# Altium footprint library goldpin_female_pcb.PcbLib: 81 footprints (part 3 of 6)
Each footprint in its own frame and in the unit in brackets; x right, y up, seen from the top. Pads: shape width x height; smd on the part's side, far side on the other; paste and mask are expansions set on the pad; w line width, h text height; cw(c..) or ccw(c..) is an arc to the next point about the centre after c.
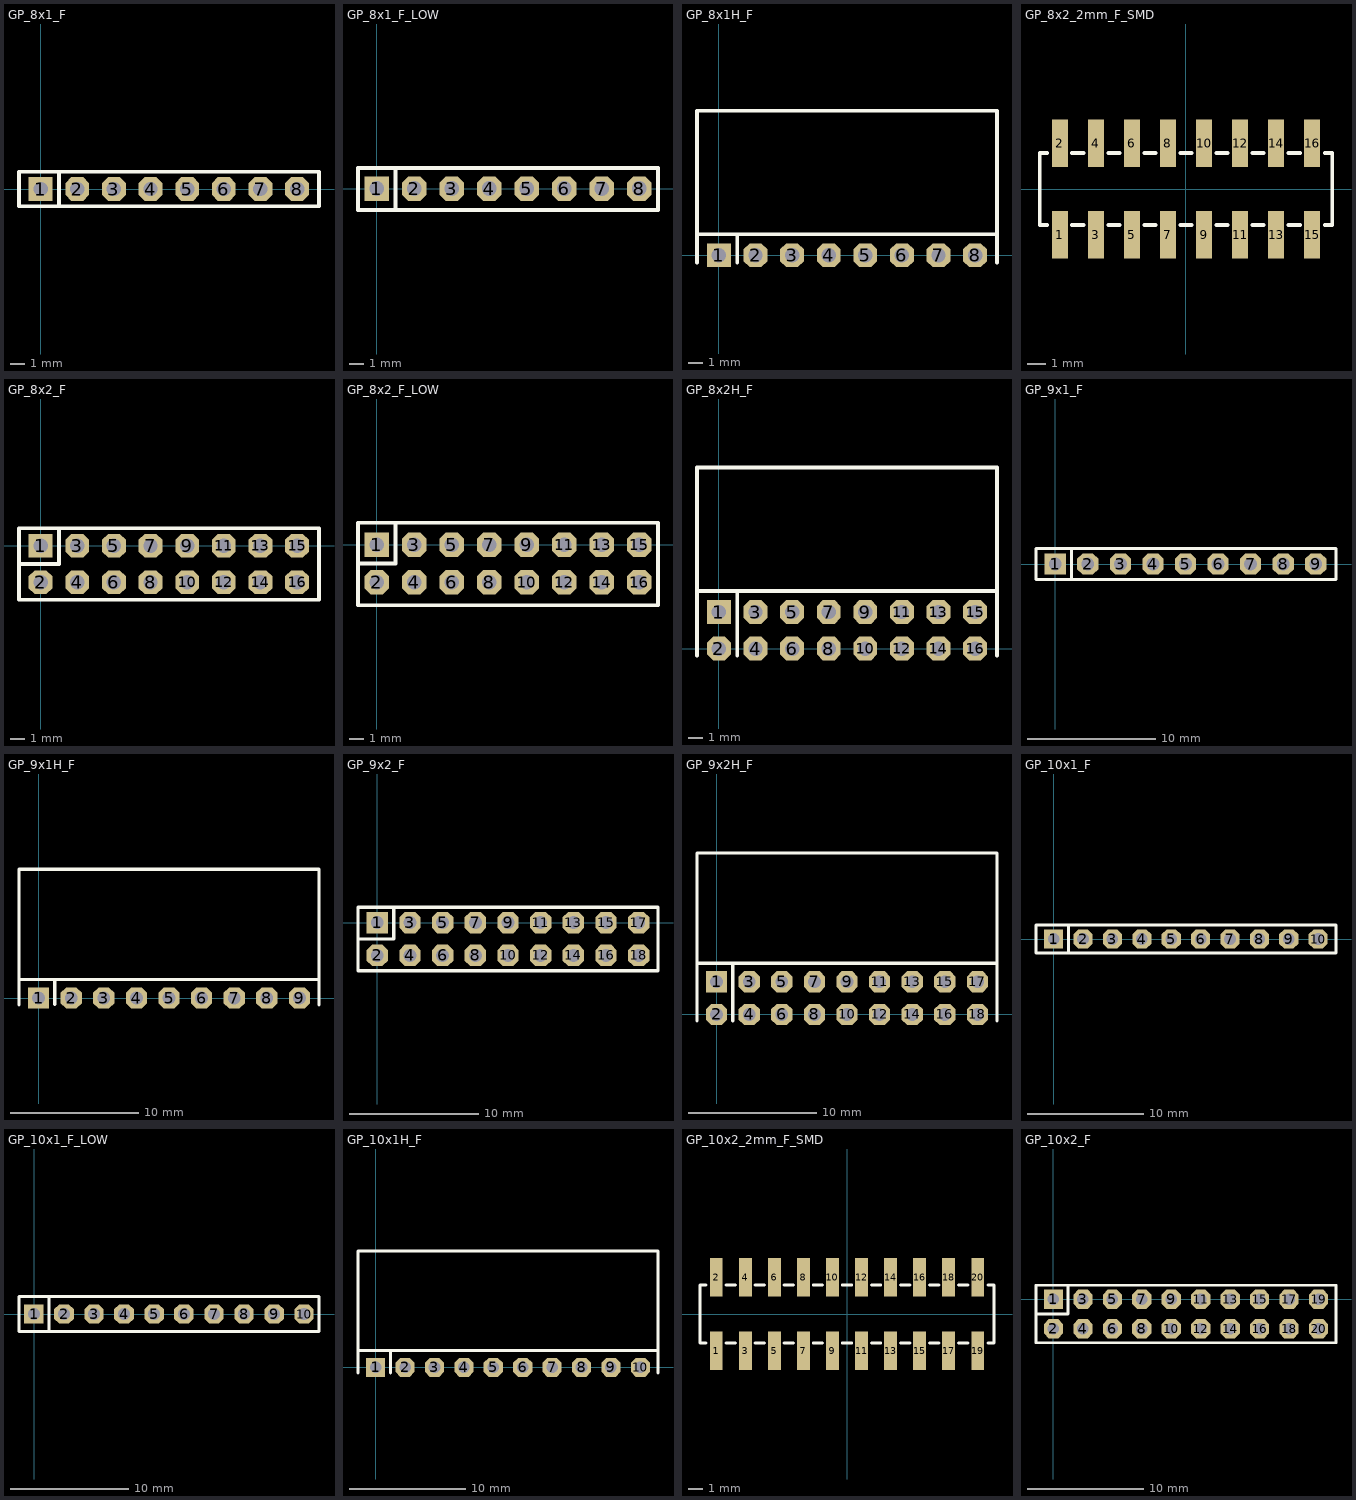
[diagram p2: the footprints below, top view; thin cyan lines are the x and y axes]

## GP_8x1_F [mil]
pads (8):
  rect 65x65 hole 39.37: 1(0,0)
  oct 65x65 hole 39.37: 2(100,0) 3(200,0) 4(300,0) 5(400,0) 6(500,0) 7(600,0) 8(700,0)
Top Overlay:
  lines w10: 50,-47.24 50,47.24 ; -59.06,-47.24 -59.06,47.24 759.84,47.24 759.84,-47.24 -59.06,-47.24
3D body "Samtec-SSW-108-01-G-S.step": height 335, standoff -104, extent -60,-47.49 760,47.51

## GP_8x1_F_LOW [mil]
pads (8):
  rect 65x65 hole 39.37: 1(0,0)
  oct 65x65 hole 39.37: 2(100,0) 3(200,0) 4(300,0) 5(400,0) 6(500,0) 7(600,0) 8(700,0)
Top Overlay:
  lines w10: 50,-57.09 50,55.12 ; -50,-57.09 750,-57.09 750,55.12 -50,55.12 -50,-57.09
3D body "Samtec-CES-108-01-G-S.step": height 200.79, standoff -127.21, extent -51.18,-61.97 748.82,58.03

## GP_8x1H_F [mil]
pads (8):
  rect 65x65 hole 39.37: 1(0,0)
  oct 65x65 hole 39.37: 2(100,0) 3(200,0) 4(300,0) 5(400,0) 6(500,0) 7(600,0) 8(700,0)
Top Overlay:
  lines w10: -60,-20 -60,395 760,395 760,-20 ; -60,57.24 759.84,57.24 ; 50,-19.68 50,57.24
3D body "Samtec-SSW-108-22-G-S-RA.step": height 96.71, standoff -98.29, extent -60,-10 760,393

## GP_8x2_2mm_F_SMD [mm]
pads (16):
  rect 0.89x2.65 smd: 1(-7,-2.54) 2(-7,2.54) 3(-5,-2.54) 4(-5,2.54) 5(-3,-2.54) 6(-3,2.54) 7(-1,-2.54) 8(-1,2.54) 9(1,-2.54) 10(1,2.54) 11(3,-2.54) 12(3,2.54) 13(5,-2.54) 14(5,2.54) 15(7,-2.54) 16(7,2.54)
Top Overlay:
  lines w0.2: -7.7,-2 -8.125,-2 -8.125,2 -7.7,2 ; -6.325,-2 -5.675,-2 ; -6.325,2 -5.675,2 ; -4.325,-2 -3.675,-2 ; -4.325,2 -3.675,2 ; -2.325,-2 -1.675,-2 ; -2.325,2 -1.675,2 ; -0.325,-2 0.325,-2 ; -0.325,2 0.325,2 ; 1.675,-2 2.325,-2 ; 1.675,2 2.325,2 ; 3.675,-2 4.325,-2 ; 3.675,2 4.325,2 ; 5.675,-2 6.325,-2 ; 5.675,2 6.325,2 ; 7.7,-2 8.125,-2 8.125,2 7.7,2
3D body "Samtec-MMS-108-2-L-DV.STEP": height 4.44, standoff -0.05, extent -8.125,-3.218 8.113,3.218

## GP_8x2_F [mil]
pads (16):
  rect 65x65 hole 39.37: 1(0,0)
  oct 65x65 hole 39.37: 2(0,-100) 3(100,0) 4(100,-100) 5(200,0) 6(200,-100) 7(300,0) 8(300,-100) 9(400,0) 10(400,-100) 11(500,0) 12(500,-100) 13(600,0) 14(600,-100) 15(700,0) 16(700,-100)
Top Overlay:
  lines w10: -59.06,-50 50,-50 50,47.51 ; -59.06,-147.49 759.84,-147.49 759.84,47.51 -59.06,47.51 -59.06,-147.49
3D body "Samtec-SSW-108-01-G-D.step": height 335, standoff -104, extent -60,-147.49 760,47.51

## GP_8x2_F_LOW [mil]
pads (16):
  rect 65x65 hole 39.37: 1(0,0)
  oct 65x65 hole 39.37: 2(0,-100) 3(100,0) 4(100,-100) 5(200,0) 6(200,-100) 7(300,0) 8(300,-100) 9(400,0) 10(400,-100) 11(500,0) 12(500,-100) 13(600,0) 14(600,-100) 15(700,0) 16(700,-100)
Top Overlay:
  lines w10: -50,-50 50,-50 50,59.06 ; 750,-161.42 -50,-161.42 -50,59.06 750,59.06 750,-159.06
3D body "Samtec-CES-108-01-G-D.step": height 200.79, standoff -127.21, extent -49.6,-160.79 750.39,59.21

## GP_8x2H_F [mil]
pads (16):
  rect 65x65 hole 39.37: 1(0,100)
  oct 65x65 hole 39.37: 2(0,0) 3(100,100) 4(100,0) 5(200,100) 6(200,0) 7(300,100) 8(300,0) 9(400,100) 10(400,0) 11(500,100) 12(500,0) 13(600,100) 14(600,0) 15(700,100) 16(700,0)
Top Overlay:
  lines w10: -60,-20 -60,495 760,495 760,-20 ; -60,157.24 760,157.24 ; 50,-20 50,157.24
3D body "Samtec-SSW-108-22-G-D-RA.step": height 197.89, standoff -97.11, extent -59.06,-10.87 760.94,492.13

## GP_9x1_F [mil]
pads (9):
  rect 65x65 hole 39.37: 1(0,0)
  oct 65x65 hole 39.37: 2(100,0) 3(200,0) 4(300,0) 5(400,0) 6(500,0) 7(600,0) 8(700,0) 9(800,0)
Top Overlay:
  lines w10: 50,-47.24 50,45 ; -59.06,-47.24 -59.06,47.24 862.2,47.24 862.2,-47.24 -59.06,-47.24
3D body "Samtec-SSW-109-01-G-S.step": height 335, standoff -104, extent -60,-47.5 860,47.5

## GP_9x1H_F [mil]
pads (9):
  rect 65x65 hole 39.37: 1(0,0)
  oct 65x65 hole 39.37: 2(100,0) 3(200,0) 4(300,0) 5(400,0) 6(500,0) 7(600,0) 8(700,0) 9(800,0)
Top Overlay:
  lines w10: -60,-20 -60,395 860,395 860,-20 ; -60,57.24 860,57.24 ; 50,-19.68 50,57.24
3D body "Samtec-SSW-109-22-G-S-RA.step": height 96.71, standoff -98.29, extent -60,-10 860,393

## GP_9x2_F [mil]
pads (18):
  rect 65x65 hole 39.37: 1(0,0)
  oct 65x65 hole 39.37: 2(0,-100) 3(100,0) 4(100,-100) 5(200,0) 6(200,-100) 7(300,0) 8(300,-100) 9(400,0) 10(400,-100) 11(500,0) 12(500,-100) 13(600,0) 14(600,-100) 15(700,0) 16(700,-100) 17(800,0) 18(800,-100)
Top Overlay:
  lines w10: -59.06,-50 50,-50 50,47.51 ; 858.27,-147.49 -59.06,-147.49 -59.06,47.51 858.27,47.51 ; 859.06,-147.51 859.06,47.49
3D body "Samtec-SSW-109-01-G-D.step": height 335, standoff -104, extent -60,-147.5 860,47.5

## GP_9x2H_F [mil]
pads (18):
  rect 65x65 hole 39.37: 1(0,100)
  oct 65x65 hole 39.37: 2(0,0) 3(100,100) 4(100,0) 5(200,100) 6(200,0) 7(300,100) 8(300,0) 9(400,100) 10(400,0) 11(500,100) 12(500,0) 13(600,100) 14(600,0) 15(700,100) 16(700,0) 17(800,100) 18(800,0)
Top Overlay:
  lines w10: -60,-20 -60,495 860,495 860,-20 ; -60,157.24 860,157.24 ; 50,-20 50,157.24
3D body "Samtec-SSW-109-22-G-D-RA.step": height 197.89, standoff -97.11, extent -59.06,-10.87 860.94,492.13

## GP_10x1_F [mil]
pads (10):
  rect 65x65 hole 39.37: 1(0,0)
  oct 65x65 hole 39.37: 2(100,0) 3(200,0) 4(300,0) 5(400,0) 6(500,0) 7(600,0) 8(700,0) 9(800,0) 10(900,0)
Top Overlay:
  lines w10: 50,-47.24 50,45 ; -60,-47.24 -60,47.24 960.63,47.24 960.63,-47.24 -60,-47.24
3D body "Samtec-SSW-110-01-G-S.step": height 335, standoff -104, extent -60,-47.49 960,47.51

## GP_10x1_F_LOW [mil]
pads (10):
  rect 65x65 hole 39.37: 1(0,0)
  oct 65x65 hole 39.37: 2(100,0) 3(200,0) 4(300,0) 5(400,0) 6(500,0) 7(600,0) 8(700,0) 9(800,0) 10(900,0)
Top Overlay:
  lines w10: 50,-59.06 50,59.06 ; -50,-59.06 950,-59.06 950,59.06 -50,59.06 -50,-59.06
3D body "Samtec-CES-110-01-G-S.step": height 200.79, standoff -127.21, extent -51.18,-61.97 948.82,58.03

## GP_10x1H_F [mil]
pads (10):
  rect 65x65 hole 39.37: 1(0,0)
  oct 65x65 hole 39.37: 2(100,0) 3(200,0) 4(300,0) 5(400,0) 6(500,0) 7(600,0) 8(700,0) 9(800,0) 10(900,0)
Top Overlay:
  lines w10: -60,-20 -60,395 960,395 960,-20 ; -60,57.24 960,57.24 ; 50,-19.68 50,57.24
3D body "Samtec-SSW-110-22-G-S-RA.step": height 96.71, standoff -98.29, extent -60,-10 960,393

## GP_10x2_2mm_F_SMD [mm]
pads (20):
  rect 0.89x2.65 smd: 1(-9,-2.54) 2(-9,2.54) 3(-7,-2.54) 4(-7,2.54) 5(-5,-2.54) 6(-5,2.54) 7(-3,-2.54) 8(-3,2.54) 9(-1,-2.54) 10(-1,2.54) 11(1,-2.54) 12(1,2.54) 13(3,-2.54) 14(3,2.54) 15(5,-2.54) 16(5,2.54) 17(7,-2.54) 18(7,2.54) 19(9,-2.54) 20(9,2.54)
Top Overlay:
  lines w0.2: -9.7,-2 -10.125,-2 -10.125,2 -9.7,2 ; -8.325,-2 -7.675,-2 ; -8.325,2 -7.675,2 ; -6.325,-2 -5.675,-2 ; -6.325,2 -5.675,2 ; -4.325,-2 -3.675,-2 ; -4.325,2 -3.675,2 ; -2.325,-2 -1.675,-2 ; -2.325,2 -1.675,2 ; -0.325,-2 0.325,-2 ; -0.325,2 0.325,2 ; 1.675,-2 2.325,-2 ; 1.675,2 2.325,2 ; 3.675,-2 4.325,-2 ; 3.675,2 4.325,2 ; 5.675,-2 6.325,-2 ; 5.675,2 6.325,2 ; 7.675,-2 8.325,-2 ; 7.675,2 8.325,2 ; 9.7,-2 10.125,-2 10.125,2 9.7,2
3D body "Samtec-MMS-110-2-L-DV.STEP": height 4.44, standoff -0.05, extent -10.118,-3.218 10.118,3.218

## GP_10x2_F [mil]
pads (20):
  rect 65x65 hole 39.37: 1(0,0)
  oct 65x65 hole 39.37: 2(0,-100) 3(100,0) 4(100,-100) 5(200,0) 6(200,-100) 7(300,0) 8(300,-100) 9(400,0) 10(400,-100) 11(500,0) 12(500,-100) 13(600,0) 14(600,-100) 15(700,0) 16(700,-100) 17(800,0) 18(800,-100) 19(900,0) 20(900,-100)
Top Overlay:
  lines w10: -59.06,-50 50,-50 50,47.51 ; -59.06,-147.49 959.06,-147.49 959.06,47.49 -59.06,47.51 -59.06,-147.49
3D body "Samtec-SSW-110-01-G-D.step": height 335, standoff -104, extent -60,-147.49 960,47.51